# Altium footprint library PCB-PCEIOT.PcbLib: 119 footprints (part 8 of 8)
Each footprint in its own frame and in the unit in brackets; x right, y up, seen from the top. Pads: shape width x height; smd on the part's side, far side on the other; paste and mask are expansions set on the pad; w line width, h text height; cw(c..) or ccw(c..) is an arc to the next point about the centre after c.
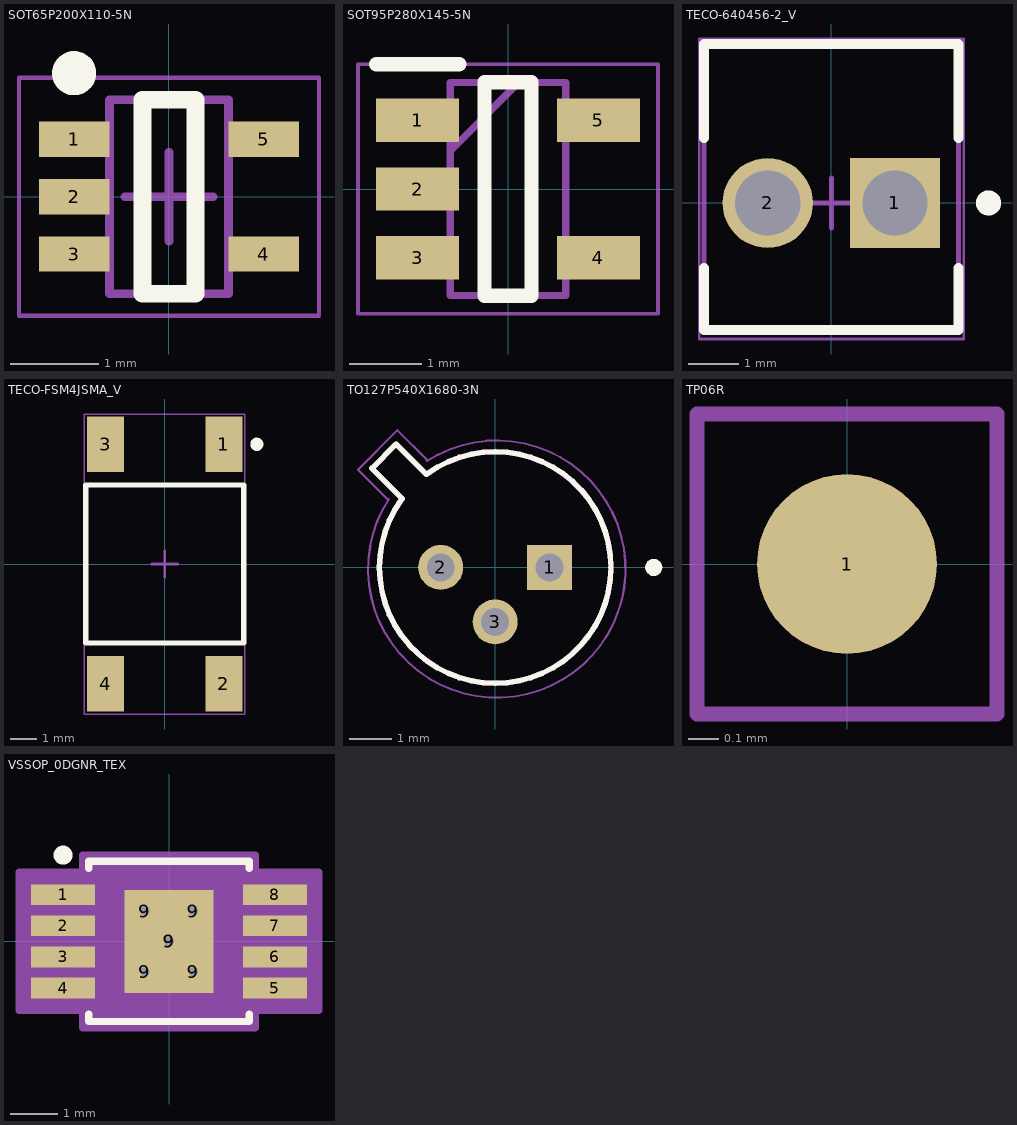
[diagram p7: the footprints below, top view; thin cyan lines are the x and y axes]

## SOT65P200X110-5N [mm] "SOT23, 5-Leads, Body 2,00x2,00mm, Pitch 0,65mm, IPC Medium Density"
height 1.1
pads (5):
  rect 0.8x0.4 smd mask+0.02: 1(-1.075,0.65) 2(-1.075,0) 3(-1.075,-0.65) 4(1.075,-0.65) 5(1.075,0.65)
Top Overlay:
  circle w0.25: c-1.075,1.4 r0.125
  lines w0.2: -0.3,-1.1 0.3,-1.1 0.3,1.1 -0.3,1.1 -0.3,-1.1
Mechanical 13:
  lines w0.1: -0.675,-1.1 -0.675,1.1 0.675,1.1 0.675,-1.1 -0.675,-1.1
Mechanical 15:
  lines w0.05: -1.7,-1.35 -1.7,1.35 1.7,1.35 1.7,-1.35 -1.7,-1.35
  lines w0.1: -0.5,0 0.5,0 ; 0,-0.5 0,0.5
3D body "SOT65P200X110-5N.step": height 1.1, standoff 0, extent -1.2,-1.1 1.2,1.1

## SOT95P280X145-5N [mm]
pads (5):
  rect 1.15x0.6 smd: 1(-1.25,0.95) 2(-1.25,0) 3(-1.25,-0.95) 4(1.25,-0.95) 5(1.25,0.95)
Top Overlay:
  lines w0.2: -1.825,1.725 -1.538,1.725 -0.962,1.725 -0.675,1.725 ; -0.325,-1.475 0.325,-1.475 0.325,1.475 -0.325,1.475 -0.325,-1.475
Mechanical 13:
  lines w0.1: -0.8,0.525 0.15,1.475 ; -0.8,-1.475 0.8,-1.475 0.8,1.475 -0.8,1.475 -0.8,-1.475
Mechanical 15:
  lines w0.05: -2.075,-1.725 2.075,-1.725 2.075,1.725 -2.075,1.725 -2.075,-1.725
3D body "LDCL015MR.stp": height 1.45, standoff 0, extent -1.4,-1.475 1.4,1.475

## TECO-640456-2_V [mm] "HDR, 2-Leads, Body 5.715x5.08mm, Pitch 2.54mm"
height 10.49
pads (2):
  rect 1.8x1.8 hole 1.3: 1(1.27,0)
  round 1.8 hole 1.3: 2(-1.27,0)
Top Overlay:
  circle w0.25: c3.14,0 r0.125
  lines w0.2: -2.54,-1.3 -2.54,-2.54 2.54,-2.54 2.54,-1.3 ; -2.54,1.3 -2.54,3.175 2.54,3.175 2.54,1.3
Mechanical 13:
  lines w0.1: -2.54,-2.54 2.54,-2.54 2.54,3.175 -2.54,3.175 -2.54,-2.54
Mechanical 15:
  lines w0.05: -2.64,-2.717 -2.64,3.275 2.64,3.275 2.64,-2.717 -2.64,-2.717
  lines w0.1: -0.5,0 0.5,0 ; 0,-0.5 0,0.5
3D body "c-640456-2-aa-3d.stp": height 9.4, standoff -4.19, extent -2.54,-2.667 2.54,3.175

## TECO-FSM4JSMA_V [mm] "SMD, 4-Leads, Body 6x6mm, Pitch 4.5mm"
height 5.23
pads (4):
  rect 1.4x2.1 smd: 1(2.25,4.55) 2(2.25,-4.55) 3(-2.25,4.55) 4(-2.25,-4.55)
Top Overlay:
  circle w0.25: c3.5,4.55 r0.125
  lines w0.2: -3,-3 -3,3 3,3 3,-3 -3,-3
Mechanical 13:
  lines w0.1: -3,-3 3,-3 3,3 -3,3 -3,-3
Mechanical 15:
  lines w0.05: -3.05,-5.7 3.05,-5.7 3.05,5.7 -3.05,5.7 -3.05,-5.7
  lines w0.1: -0.5,0 0.5,0 ; 0,-0.5 0,0.5
3D body "c-4-1437565-2-s-3d.stp": height 5.08, standoff 0, extent -3,-5 3,5

## TO127P540X1680-3N [mm]
pads (3):
  rect 1.05x1.05 hole 0.65: 1(1.27,0)
  round 1.05 hole 0.65: 2(-1.27,0) 3(0,-1.27)
Top Overlay:
  circle w0.2: c3.7,0 r0.1
  lines w0.127: -2.184,1.587 ccw(c0.001,-0.001) -1.587,2.184 ; -2.171,1.605 -2.878,2.312 -2.312,2.878 -1.605,2.171
Mechanical 13:
  lines w0.127: -2.184,1.587 ccw(c0.001,-0.001) -1.587,2.184 ; -2.171,1.605 -2.878,2.312 -2.312,2.878 -1.605,2.171
Mechanical 15:
  lines w0.05: -2.494,1.575 -3.201,2.282 -2.282,3.201 -1.575,2.494 ; -2.48,1.597 ccw(c0.038,-0.038) -1.597,2.48
  text ".Designator" at 0.31,-2.743 h1.2
3D body "MTPD1346D-150.stp": height 3.2, standoff -13.6, extent -2.7,-2.7 2.7,2.7

## TP06R [mm] "Testpoint, round, d=0.6mm"
height 0.6
pads (1):
  round 0.6 smd paste-1: 1(0,0)
Top Assembly:
  lines w0.05: -0.5,-0.5 0.5,-0.5 0.5,0.5 -0.5,0.5 -0.5,-0.5
Top Designator:
  text ".Designator" at -1.27,0.254 h0.6

## VSSOP_0DGNR_TEX [mil]
pads (14):
  rect 52.5x17 smd paste+0 mask+0: 1(-87.25,38.38) 2(-87.25,12.79) 3(-87.25,-12.79) 4(-87.25,-38.38) 5(87.25,-38.38) 6(87.25,-12.79) 7(87.25,12.79) 8(87.25,38.38)
  round 19.68 hole 7.87 mask-7.87: 9(-20,-25) 9(-20,25) 9(0,0) 9(20,-25) 9(20,25)
  rect 73x85 smd paste+0 mask+0: 9(0,0)
Top Overlay:
  circle w7.87: c-87.25,71 r3.94
  lines w6: -66,-59.98 -66,-66 66,-66 66,-59.98 ; -66,59.98 -66,66 66,66 66,59.98
Mechanical 13:
  lines w1: -12,61 ccw(c0,61) 12,61 ; -99.5,-45.88 -99.5,-30.89 -61,-30.89 -61,-45.88 -99.5,-45.88 ; -99.5,-20.3 -99.5,-5.29 -61,-5.29 -61,-20.3 -99.5,-20.3 ; -99.5,5.29 -99.5,20.3 -61,20.3 -61,5.29 -99.5,5.29 ; -99.5,30.89 -99.5,45.88 -61,45.88 -61,30.89 -99.5,30.89 ; -61,-61 61,-61 61,61 -61,61 -61,-61 ; 61,-45.88 61,-30.89 99.5,-30.89 99.5,-45.88 61,-45.88 ; 61,-20.3 61,-5.29 99.5,-5.29 99.5,-20.3 61,-20.3 ; 61,5.29 61,20.3 99.5,20.3 99.5,5.29 61,5.29 ; 61,30.89 61,45.88 99.5,45.88 99.5,30.89 61,30.89
  text "*" at -58.5,8 h50
Mechanical 15:
  region: -71,-56.88 -123.5,-56.88 -123.5,56.88 -71,56.88 -71,71 71,71 71,56.88 123.5,56.88 123.5,-56.88 71,-56.88 71,-71 -71,-71
  lines w6: -123.5,-56.88 -123.5,56.88 -71,56.88 -71,71 71,71 71,56.88 123.5,56.88 123.5,-56.88 71,-56.88 71,-71 -71,-71 -71,-56.88 -123.5,-56.88
  text ".Designator" at 10.69,-106.49 h47.24
3D body "VSSOP_0DGNR_TEX.step": height 43.11, standoff -2.01, extent -99.49,-60.98 99.49,60.98